# Altium footprint library camera_module.PcbLib: 26 footprints (part 1 of 2)
Each footprint in its own frame and in the unit in brackets; x right, y up, seen from the top. Pads: shape width x height; smd on the part's side, far side on the other; paste and mask are expansions set on the pad; w line width, h text height; cw(c..) or ccw(c..) is an arc to the next point about the centre after c.
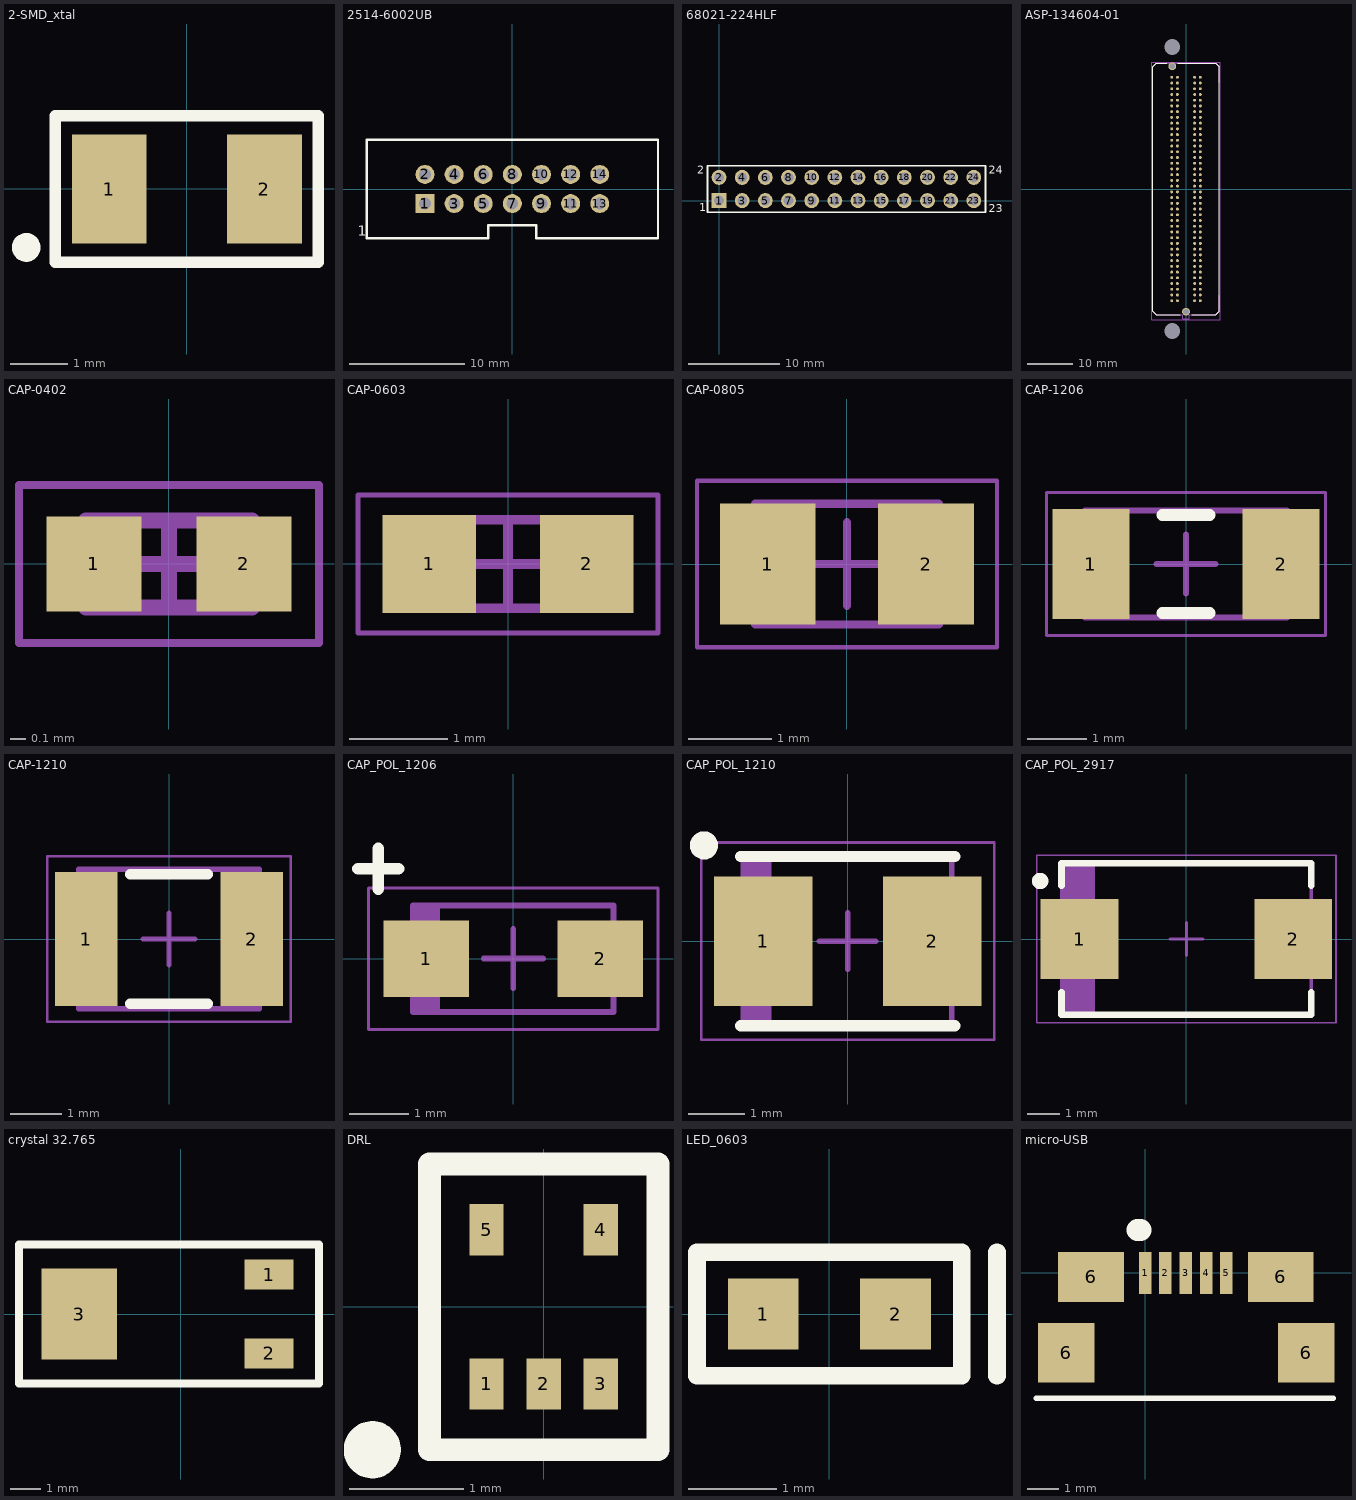
[diagram p0: the footprints below, top view; thin cyan lines are the x and y axes]

## 2-SMD_xtal [mm] "3.2x1.5"
pads (2):
  rect 1.3x1.9 smd: 1(-1.35,0) 2(1.35,0)
Top Overlay:
  circle w0.25: c-2.794,-1.016 r0.125
  lines w0.2: -2.286,-1.27 2.286,-1.27 2.286,1.27 -2.286,1.27 -2.286,-1.27
3D body "ABS07.STEP": height 0.89, standoff 0, extent -1.6,-0.749 1.6,0.749

## 2514-6002UB [mil] "SHROUDED HEADER 14 POS STRAIGHT"
pads (14):
  rect 65x65 / inner rect 62.99x62.99 / far side rect 56.5x56.5 hole 40 paste+0: 1(-300,-50)
  round 65 / inner round 62.99 / far side round 56.5 hole 40 paste+0: 2(-300,50) 3(-200,-50) 4(-200,50) 5(-100,-50) 6(-100,50) 7(0,-50) 8(0,50) 9(100,-50) 10(100,50) 11(200,-50) 12(200,50) 13(300,-50) 14(300,50)
Top Overlay:
  lines w8: -500,-169 -500,169 500,169 500,-169 82.5,-169 82.5,-125 -82.5,-125 -82.5,-169 -500,-169
  text "1" at -530,-160 h35
3D body "702461404.stp": height 364.96, standoff -135, extent -500,-175 500,175

## 68021-224HLF [mil] "2X12 24pos right angle header"
pads (24):
  rect 64x64 hole 42: 1(0,0)
  round 64 hole 42: 2(0,100) 3(100,0) 4(100,100) 5(200,0) 6(200,100) 7(300,0) 8(300,100) 9(400,0) 10(400,100) 11(500,0) 12(500,100) 13(600,0) 14(600,100) 15(700,0) 16(700,100) 17(800,0) 18(800,100) 19(900,0) 20(900,100) 21(1000,0) 22(1000,100) 23(1100,0) 24(1100,100)
Top Overlay:
  lines w7.87: -50,-50 1150,-50 1150,150 -50,150 -50,-50
  text "24" at 1165,115 h35
  text "23" at 1165,-50 h35
  text "2" at -95,115 h35
  text "1" at -85,-45 h35

## ASP-134604-01 [mm] "FPC 0.050 Pitch Socket Array Assembly"
height 6.55
pads (164):
  round 1.524 hole 3.5: 0(-3.05,-31.5) 0(-3.05,31.5)
  round 0.64 smd: C1(3.175,-24.765) C2(3.175,-23.495) C3(3.175,-22.225) C4(3.175,-20.955) C5(3.175,-19.685) C6(3.175,-18.415) C7(3.175,-17.145) C8(3.175,-15.875) C9(3.175,-14.605) C10(3.175,-13.335) C11(3.175,-12.065) C12(3.175,-10.795) C13(3.175,-9.525) C14(3.175,-8.255) C15(3.175,-6.985) C16(3.175,-5.715) C17(3.175,-4.445) C18(3.175,-3.175) C19(3.175,-1.905) C20(3.175,-0.635) C21(3.175,0.635) C22(3.175,1.905) C23(3.175,3.175) C24(3.175,4.445) C25(3.175,5.715) C26(3.175,6.985) C27(3.175,8.255) C28(3.175,9.525) C29(3.175,10.795) C30(3.175,12.065) C31(3.175,13.335) C32(3.175,14.605) C33(3.175,15.875) C34(3.175,17.145) C35(3.175,18.415) C36(3.175,19.685) C37(3.175,20.955) C38(3.175,22.225) C39(3.175,23.495) C40(3.175,24.765) D1(1.905,-24.765) D2(1.905,-23.495) D3(1.905,-22.225) D4(1.905,-20.955) D5(1.905,-19.685) D6(1.905,-18.415) D7(1.905,-17.145) D8(1.905,-15.875) D9(1.905,-14.605) D10(1.905,-13.335) D11(1.905,-12.065) D12(1.905,-10.795) D13(1.905,-9.525) D14(1.905,-8.255) D15(1.905,-6.985) D16(1.905,-5.715) D17(1.905,-4.445) D18(1.905,-3.175) D19(1.905,-1.905) D20(1.905,-0.635) D21(1.905,0.635) D22(1.905,1.905) D23(1.905,3.175) D24(1.905,4.445) D25(1.905,5.715) D26(1.905,6.985) D27(1.905,8.255) D28(1.905,9.525) D29(1.905,10.795) D30(1.905,12.065) D31(1.905,13.335) D32(1.905,14.605) D33(1.905,15.875) D34(1.905,17.145) D35(1.905,18.415) D36(1.905,19.685) D37(1.905,20.955) D38(1.905,22.225) D39(1.905,23.495) D40(1.905,24.765) G1(-1.905,-24.765) G2(-1.905,-23.495) G3(-1.905,-22.225) G4(-1.905,-20.955) G5(-1.905,-19.685) G6(-1.905,-18.415) G7(-1.905,-17.145) G8(-1.905,-15.875) G9(-1.905,-14.605) G10(-1.905,-13.335) G11(-1.905,-12.065) G12(-1.905,-10.795) G13(-1.905,-9.525) G14(-1.905,-8.255) G15(-1.905,-6.985) G16(-1.905,-5.715) G17(-1.905,-4.445) G18(-1.905,-3.175) G19(-1.905,-1.905) G20(-1.905,-0.635) G21(-1.905,0.635) G22(-1.905,1.905) G23(-1.905,3.175) G24(-1.905,4.445) G25(-1.905,5.715) G26(-1.905,6.985) G27(-1.905,8.255) G28(-1.905,9.525) G29(-1.905,10.795) G30(-1.905,12.065) G31(-1.905,13.335) G32(-1.905,14.605) G33(-1.905,15.875) G34(-1.905,17.145) G35(-1.905,18.415) G36(-1.905,19.685) G37(-1.905,20.955) G38(-1.905,22.225) G39(-1.905,23.495) G40(-1.905,24.765) H1(-3.175,-24.765) H2(-3.175,-23.495) H3(-3.175,-22.225) H4(-3.175,-20.955) H5(-3.175,-19.685) H6(-3.175,-18.415) H7(-3.175,-17.145) H8(-3.175,-15.875) H9(-3.175,-14.605) H10(-3.175,-13.335) H11(-3.175,-12.065) H12(-3.175,-10.795) H13(-3.175,-9.525) H14(-3.175,-8.255) H15(-3.175,-6.985) H16(-3.175,-5.715) H17(-3.175,-4.445) H18(-3.175,-3.175) H19(-3.175,-1.905) H20(-3.175,-0.635) H21(-3.175,0.635) H22(-3.175,1.905) H23(-3.175,3.175) H24(-3.175,4.445) H25(-3.175,5.715) H26(-3.175,6.985) H27(-3.175,8.255) H28(-3.175,9.525) H29(-3.175,10.795) H30(-3.175,12.065) H31(-3.175,13.335) H32(-3.175,14.605) H33(-3.175,15.875) H34(-3.175,17.145) H35(-3.175,18.415) H36(-3.175,19.685) H37(-3.175,20.955) H38(-3.175,22.225) H39(-3.175,23.495) H40(-3.175,24.765)
  round 1.727 hole 1.27: S1(0,-27.19)
  round 1.727 hole 1.27 unplated: S2(-3.05,27.19)
Top Overlay:
  lines w0.2: -4.318,27.888 -6.58,27.888 -7.343,27.126 -7.343,23.647 -7.343,-23.648 -7.343,-27.128 -6.58,-27.89 -1.27,-27.89 ; -1.778,27.888 6.577,27.888 7.339,27.126 7.339,23.647 7.339,-23.648 7.339,-27.128 6.577,-27.89 1.27,-27.89
Mechanical 13:
  lines w0.1: -7.343,-23.648 -7.343,-27.128 -6.581,-27.89 -0.764,-27.89 -0.764,-28.779 0.76,-28.779 0.76,-27.89 6.577,-27.89 7.339,-27.128 7.339,-23.648 ; -7.343,23.647 -7.343,27.126 -6.581,27.888 6.577,27.888 7.339,27.126 7.339,23.647 ; -2.903,27.562 ccw(c-3.061,27.412) -3.212,27.569 -3.56,27.29 ccw(c-3.459,27.193) -3.556,27.092 -3.207,26.813 ccw(c-3.056,26.97) -2.898,26.819 -2.55,27.099 ccw(c-2.646,27.2) -2.545,27.297 -2.894,27.576
Mechanical 15:
  lines w0.1: -7.593,28.139 -7.593,-29.029 7.589,-29.029 7.589,28.139 -7.589,28.139
3D body "ASP-134604-01.step": height 6.38, standoff -2.01, extent -7.341,-28.714 7.341,27.953

## CAP-0402 [mm] "Chip Capacitor, 2-Leads, Body 1.00x0.50mm, IPC Medium Density"
height 0.55
pads (2):
  rect 0.6x0.6 smd: 1(-0.475,0) 2(0.475,0)
Mechanical 13:
  lines w0.1: -0.525,-0.275 -0.525,0.275 0.525,0.275 0.525,-0.275 -0.525,-0.275
Mechanical 15:
  lines w0.05: -0.95,-0.5 -0.95,0.5 0.95,0.5 0.95,-0.5 -0.95,-0.5
  lines w0.1: -0.275,0 0.275,0 ; 0,-0.275 0,0.275
3D body: height 0.55, standoff 0, extent -0.275,-0.275 0.275,0.275
3D body: height 0.55, standoff 0, extent -0.525,-0.275 -0.275,0.275
3D body: height 0.55, standoff 0, extent 0.275,-0.275 0.525,0.275

## CAP-0603 [mm] "Chip Capacitor, 2-Leads, Body 1.60x0.80mm, IPC Medium Density"
height 0.9
pads (2):
  rect 0.95x1 smd: 1(-0.8,0) 2(0.8,0)
Mechanical 13:
  lines w0.1: -0.85,-0.45 0.85,-0.45 0.85,0.45 -0.85,0.45 -0.85,-0.45
Mechanical 15:
  lines w0.05: -1.524,-0.7 1.524,-0.7 1.524,0.7 -1.524,0.7 -1.524,-0.7
  lines w0.1: -0.45,0 0.45,0 ; 0,-0.45 0,0.45
3D body: height 0.9, standoff 0, extent 0.5,-0.45 0.85,0.45
3D body: height 0.9, standoff 0, extent -0.85,-0.45 -0.5,0.45
3D body: height 0.9, standoff 0, extent -0.5,-0.45 0.5,0.45

## CAP-0805 [mm] "Chip Capacitor, 2-Leads, Body 2.00x1.25mm, IPC Medium Density"
height 1.1
pads (2):
  rect 1.15x1.45 smd: 1(-0.95,0) 2(0.95,0)
Mechanical 13:
  lines w0.1: -1.1,-0.725 1.1,-0.725 1.1,0.725 -1.1,0.725 -1.1,-0.725
Mechanical 15:
  lines w0.05: -1.8,-1 1.8,-1 1.8,1 -1.8,1 -1.8,-1
  lines w0.1: -0.5,0 0.5,0 ; 0,-0.5 0,0.5
3D body: height 1.1, standoff 0, extent 0.6,-0.725 1.1,0.725
3D body: height 1.1, standoff 0, extent -1.1,-0.725 -0.6,0.725
3D body: height 1.1, standoff 0, extent -0.6,-0.725 0.6,0.725

## CAP-1206 [mm] "Chip Capacitor, 2-Leads, Body 3.20x1.60mm, IPC Medium Density"
height 1.35
pads (2):
  rect 1.3x1.85 smd: 1(-1.6,0) 2(1.6,0)
Top Overlay:
  lines w0.2: -0.4,-0.825 0.4,-0.825 ; -0.4,0.825 0.4,0.825
Mechanical 13:
  lines w0.1: -1.7,-0.9 -1.7,0.9 1.7,0.9 1.7,-0.9 -1.7,-0.9
Mechanical 15:
  lines w0.05: -2.35,-1.2 -2.35,1.2 2.35,1.2 2.35,-1.2 -2.35,-1.2
  lines w0.1: -0.5,0 0.5,0 ; 0,-0.5 0,0.5
3D body: height 1.35, standoff 0, extent -1.2,-0.9 1.2,0.9
3D body: height 1.35, standoff 0, extent -1.7,-0.9 -1.2,0.9
3D body: height 1.35, standoff 0, extent 1.2,-0.9 1.7,0.9

## CAP-1210 [mm] "Chip Capacitor, 2-Leads, Body 3.20x2.50mm"
height 2.7
pads (2):
  rect 1.2x2.6 smd: 1(-1.6,0) 2(1.6,0)
Top Overlay:
  lines w0.2: -0.75,-1.25 0.75,-1.25 ; -0.75,1.25 0.75,1.25
Mechanical 13:
  lines w0.1: -1.75,-1.35 -1.75,1.35 1.75,1.35 1.75,-1.35 -1.75,-1.35
Mechanical 15:
  lines w0.05: -2.35,-1.6 -2.35,1.6 2.35,1.6 2.35,-1.6 -2.35,-1.6
  lines w0.1: -0.5,0 0.5,0 ; 0,-0.5 0,0.5
3D body: height 2.7, standoff 0, extent -1.45,-1.35 1.45,1.35
3D body: height 2.7, standoff 0, extent -1.75,-1.35 -1.45,1.35
3D body: height 2.7, standoff 0, extent 1.45,-1.35 1.75,1.35

## CAP_POL_1206 [mm] "Molded Capacitor, 2-Leads, Body 3.20x1.60mm, IPC Medium Density"
height 1.1
pads (2):
  rect 1.45x1.3 smd: 1(-1.475,0) 2(1.475,0)
Top Overlay:
  lines w0.2: -2.629,1.524 -1.943,1.524 ; -2.286,1.181 -2.286,1.867
Mechanical 13:
  rectangle: -1.7,-0.9 -1.243,0.9
  lines w0.1: -1.7,-0.9 1.7,-0.9 1.7,0.9 -1.7,0.9 -1.7,-0.9
Mechanical 15:
  lines w0.05: -2.45,-1.2 2.45,-1.2 2.45,1.2 -2.45,1.2 -2.45,-1.2
  lines w0.1: -0.5,0 0.5,0 ; 0,-0.5 0,0.5
3D body: height 1.1, standoff 0, extent -1.7,-0.9 1.7,0.9

## CAP_POL_1210 [mm] "Molded Capacitor, 2-Leads, Body 3.50x2.85mm, IPC Medium Density"
height 2.1
pads (2):
  rect 1.75x2.3 smd: 1(-1.5,0) 2(1.5,0)
Top Overlay:
  circle w0.25: c-2.55,1.7 r0.125
  lines w0.2: -1.9,-1.5 1.9,-1.5 ; -1.9,1.5 1.9,1.5
Mechanical 13:
  rectangle: -1.85,-1.5 -1.352,1.5
  lines w0.1: -1.85,-1.5 -1.85,1.5 1.85,1.5 1.85,-1.5 -1.85,-1.5
Mechanical 15:
  lines w0.05: -2.6,-1.75 -2.6,1.75 2.6,1.75 2.6,-1.75 -2.6,-1.75
  lines w0.1: -0.5,0 0.5,0 ; 0,-0.5 0,0.5
3D body: height 2.1, standoff 0, extent -1.85,-1.5 1.85,1.5

## CAP_POL_2917 [mm] "Molded Capacitor, 2-Leads, Body 7.30x4.30mm, IPC Medium Density"
height 4.3
pads (2):
  rect 2.37x2.43 smd: 1(-3.25,0) 2(3.25,0)
Top Overlay:
  circle w0.25: c-4.45,1.765 r0.125
  lines w0.2: -3.8,-1.615 -3.8,-2.3 3.8,-2.3 3.8,-1.615 ; -3.8,1.615 -3.8,2.3 3.8,2.3 3.8,1.615
Mechanical 13:
  rectangle: -3.8,-2.3 -2.778,2.3
  lines w0.1: -3.8,-2.3 -3.8,2.3 3.8,2.3 3.8,-2.3 -3.8,-2.3
Mechanical 15:
  lines w0.05: -4.55,-2.55 -4.55,2.55 4.55,2.55 4.55,-2.55 -4.55,-2.55
  lines w0.1: -0.5,0 0.5,0 ; 0,-0.5 0,0.5
3D body: height 4.3, standoff 0, extent -3.8,-2.3 3.8,2.3

## crystal 32.765 [mm] "micro crystal switerland"
pads (3):
  rect 1.6x1 smd: 1(2.9,1.3) 2(2.9,-1.3)
  rect 2.5x3 smd: 3(-3.35,0)
Top Overlay:
  lines w0.254: -5.334,-2.286 -5.334,2.286 4.547,2.286 4.547,-2.286 -5.334,-2.286
3D body "SW3dPS-TC38 SMD.STEP": height 2.24, standoff -0.01, extent -5.156,-1.344 4.344,1.446

## DRL [mm] "5 PIN Plastic Small Outline"
pads (5):
  rect 0.3x0.45 smd: 1(-0.5,-0.675) 2(0,-0.675) 3(0.5,-0.675) 4(0.5,0.675) 5(-0.5,0.675)
Top Overlay:
  circle w0.25: c-1.5,-1.25 r0.125
  lines w0.2: -1,-1.25 -1,1 -1,1.25 1,1.25 1,-1.25 -1,-1.25

## LED_0603 [mm]
pads (2):
  rect 0.8x0.8 smd: 1(-0.75,0) 2(0.75,0)
Top Overlay:
  lines w0.2: 1.9,-0.7 1.9,0.7 ; -1.5,-0.7 -1.5,0.7 1.5,0.7 1.5,-0.7 -1.5,-0.7

## micro-USB [mm]
height 2.8
pads (9):
  rect 0.4x1.35 smd: 1(-0.015,0) 2(0.635,0) 3(1.285,0) 4(1.935,0) 5(2.585,0)
  rect 1.8x1.9 smd: 6(-2.53,-2.55) 6(5.14,-2.55)
  rect 2.1x1.6 smd: 6(-1.74,-0.125) 6(4.32,-0.125)
Top Overlay:
  lines w0.175: -3.5,-4 6,-4
  lines w0.7: -0.254,1.372 -0.152,1.372